# Altium footprint library PCB_THA.PcbLib: 22 footprints (part 1 of 2)
Each footprint in its own frame and in the unit in brackets; x right, y up, seen from the top. Pads: shape width x height; smd on the part's side, far side on the other; paste and mask are expansions set on the pad; w line width, h text height; cw(c..) or ccw(c..) is an arc to the next point about the centre after c.
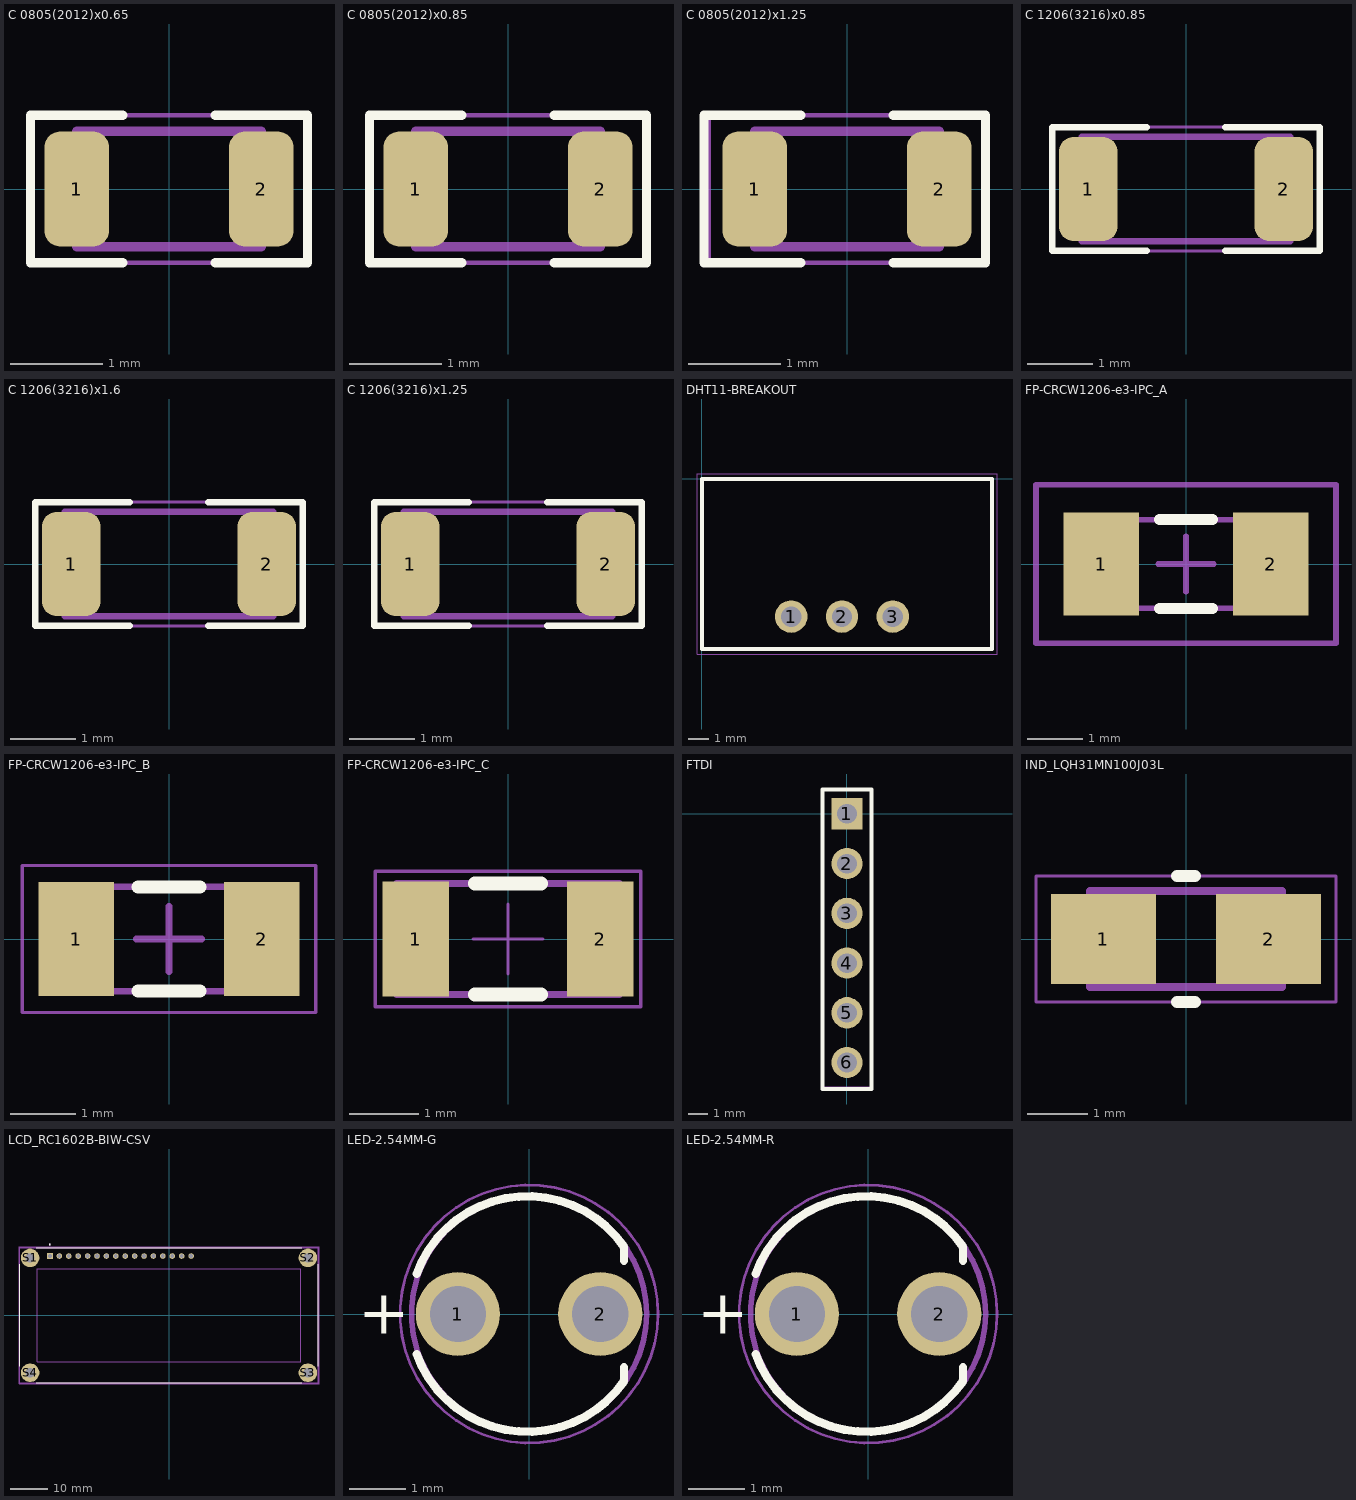
[diagram p0: the footprints below, top view; thin cyan lines are the x and y axes]

## C 0805(2012)x0.65 [mm]
height 0.65
pads (2):
  rrect50% 0.7x1.25 smd: 1(-1,0) 2(1,0)
Top Overlay:
  lines w0.1: -0.5,-0.8 -1.5,-0.8 -1.5,0.8 -0.5,0.8 ; 0.5,-0.8 1.5,-0.8 1.5,0.8 0.5,0.8
Top Designator:
  text ".Designator" at 7.618,-0.508 h1.52
Top 3D Body:
  lines w0.1: -1,-0.625 -1,0.625 1,0.625 1,-0.625 -1,-0.625
Top Courtyard:
  lines w0.05: -1.5,-0.8 1.5,-0.8 1.5,0.8 -1.5,0.8 -1.5,-0.8
3D body "Cap 0805(2012)x65N.STEP": height 0.66, standoff 0, extent -1,-0.625 1,0.625

## C 0805(2012)x0.85 [mm]
height 0.85
pads (2):
  rrect50% 0.7x1.25 smd: 1(-1,0) 2(1,0)
Top Overlay:
  lines w0.1: -0.5,-0.8 -1.5,-0.8 -1.5,0.8 -0.5,0.8 ; 0.5,-0.8 1.5,-0.8 1.5,0.8 0.5,0.8
Top Designator:
  text ".Designator" at 7.618,-0.508 h1.52
Top 3D Body:
  lines w0.1: -1,-0.625 1,-0.625 1,0.625 -1,0.625 -1,-0.625
Top Courtyard:
  lines w0.05: -1.5,-0.8 -1.5,0.8 1.5,0.8 1.5,-0.8 -1.5,-0.8
3D body "Cap 0805(2012)x85N.STEP": height 0.86, standoff 0, extent -1,-0.625 1,0.625

## C 0805(2012)x1.25 [mm]
height 1.25
pads (2):
  rrect50% 0.7x1.25 smd: 1(-1,0) 2(1,0)
Top Overlay:
  lines w0.1: -0.5,-0.8 -1.55,-0.8 -1.55,0.8 -0.5,0.8 ; 0.5,-0.8 1.5,-0.8 1.5,0.8 0.5,0.8
Top Designator:
  text ".Designator" at 7.593,-0.508 h1.52
Top 3D Body:
  lines w0.1: -1,-0.625 1,-0.625 1,0.625 -1,0.625 -1,-0.625
Top Courtyard:
  lines w0.05: -1.5,-0.8 -1.5,0.8 1.5,0.8 1.5,-0.8 -1.5,-0.8
3D body "Cap 0805(2012)x125N.STEP": height 1.26, standoff 0, extent -1,-0.625 1,0.625

## C 1206(3216)x0.85 [mm]
height 0.85
pads (2):
  rrect50% 0.9x1.6 smd mask+0.102: 1(-1.5,0) 2(1.5,0)
Top Overlay:
  lines w0.1: -0.6,-0.95 -2.05,-0.95 -2.05,0.95 -0.6,0.95 ; 0.6,-0.95 2.05,-0.95 2.05,0.95 0.6,0.95
Top Designator:
  text ".Designator" at 7.618,-0.508 h1.52
Top 3D Body:
  lines w0.1: -1.6,-0.8 -1.6,0.8 1.6,0.8 1.6,-0.8 -1.6,-0.8
Top Courtyard:
  lines w0.05: -2.05,-0.95 2.05,-0.95 2.05,0.95 -2.05,0.95 -2.05,-0.95
3D body "Cap 1206(3216)x85N.STEP": height 0.86, standoff 0, extent -1.6,-0.8 1.6,0.8

## C 1206(3216)x1.6 [mm]
height 1.6
pads (2):
  rrect50% 0.9x1.6 smd mask+0.102: 1(-1.5,0) 2(1.5,0)
Top Overlay:
  lines w0.1: -0.6,-0.95 -2.05,-0.95 -2.05,0.95 -0.6,0.95 ; 0.6,-0.95 2.05,-0.95 2.05,0.95 0.6,0.95
Top Designator:
  text ".Designator" at 7.618,-0.508 h1.52
Top 3D Body:
  lines w0.1: -1.6,-0.8 -1.6,0.8 1.6,0.8 1.6,-0.8 -1.6,-0.8
Top Courtyard:
  lines w0.05: -2.05,-0.95 2.05,-0.95 2.05,0.95 -2.05,0.95 -2.05,-0.95
3D body "Cap 1206(3216)x160N.STEP": height 1.61, standoff 0, extent -1.6,-0.8 1.6,0.8

## C 1206(3216)x1.25 [mm]
height 1.25
pads (2):
  rrect50% 0.9x1.6 smd mask+0.102: 1(-1.5,0) 2(1.5,0)
Top Overlay:
  lines w0.1: -0.6,-0.95 -2.05,-0.95 -2.05,0.95 -0.6,0.95 ; 0.6,-0.95 2.05,-0.95 2.05,0.95 0.6,0.95
Top Designator:
  text ".Designator" at 7.618,-0.508 h1.52
Top 3D Body:
  lines w0.1: -1.6,-0.8 -1.6,0.8 1.6,0.8 1.6,-0.8 -1.6,-0.8
Top Courtyard:
  lines w0.05: -2.05,-0.95 2.05,-0.95 2.05,0.95 -2.05,0.95 -2.05,-0.95
3D body "Cap 1206(3216)x125N.STEP": height 1.26, standoff 0, extent -1.6,-0.8 1.6,0.8

## DHT11-BREAKOUT [mm]
pads (3):
  round 1.62 hole 1.02: 1(4.46,-6.89) 2(7,-6.89) 3(9.54,-6.89)
Top Overlay:
  lines w0.2: 0,-8.52 0,0 14.5,0 14.5,-8.52 0,-8.52
Top Designator:
  text ".Designator" at 14.868,-4.768 h1.52
Top 3D Body:
  lines w0.1: 0,-8.52 0,0 14.5,0 14.5,-8.52 0,-8.52
Top Courtyard:
  lines w0.05: -0.25,-8.77 14.75,-8.77 14.75,0.25 -0.25,0.25 -0.25,-8.77
3D body "DHT11 Temp-Humidity Sensor.STEP": height 37.75, standoff 0.67, extent 0,-8.52 14.5,0
3D body "PinSocket_1x03_P2.54mm_Vertical.step": height 3.12, standoff -6.98, extent 3.19,-8.16 10.81,-5.62

## FP-CRCW1206-e3-IPC_A [mm]
pads (2):
  rect 1.356x1.858 smd paste+0 mask+0: 1(-1.526,0) 2(1.526,0)
Top Overlay:
  lines w0.2: -0.473,-0.8 0.473,-0.8 ; -0.473,0.8 0.473,0.8
Top Designator:
  text ".Designator" at 7.618,-0.508 h1.52
Top 3D Body:
  lines w0.1: -1.6,-0.8 1.6,-0.8 1.6,0.8 -1.6,0.8 -1.6,-0.8
Top Courtyard:
  lines w0.1: -0.5,0 0.5,0 ; 0,-0.5 0,0.5 ; -2.704,-1.429 2.704,-1.429 2.704,1.429 -2.704,1.429 -2.704,-1.429
3D body "Res_Vishay_CRCW1206619RFKEB_eec.STEP": height 0.25, standoff 0, extent -2.704,-1.429 2.704,1.429

## FP-CRCW1206-e3-IPC_B [mm]
pads (2):
  rect 1.156x1.758 smd paste+0 mask+0: 1(-1.426,0) 2(1.426,0)
Top Overlay:
  lines w0.2: -0.473,-0.8 0.473,-0.8 ; -0.473,0.8 0.473,0.8
Top Designator:
  text ".Designator" at 7.618,-0.508 h1.52
Top 3D Body:
  lines w0.1: -1.6,-0.8 1.6,-0.8 1.6,0.8 -1.6,0.8 -1.6,-0.8
Top Courtyard:
  lines w0.05: -2.254,-1.129 2.254,-1.129 2.254,1.129 -2.254,1.129 -2.254,-1.129
  lines w0.1: -0.5,0 0.5,0 ; 0,-0.5 0,0.5
3D body "Res_Vishay_CRCW1206619RFKEB_eec.STEP": height 0.25, standoff 0, extent -2.254,-1.129 2.254,1.129

## FP-CRCW1206-e3-IPC_C [mm]
pads (2):
  rect 0.956x1.658 smd paste+0 mask+0: 1(-1.326,0) 2(1.326,0)
Top Overlay:
  lines w0.2: -0.473,-0.8 0.473,-0.8 ; -0.473,0.8 0.473,0.8
Top Designator:
  text ".Designator" at 7.618,-0.508 h1.52
Top 3D Body:
  lines w0.1: -1.6,-0.8 1.6,-0.8 1.6,0.8 -1.6,0.8 -1.6,-0.8
Top Courtyard:
  lines w0.05: -0.5,0 0.5,0 ; 0,-0.5 0,0.5 ; -1.904,-0.975 1.904,-0.975 1.904,0.975 -1.904,0.975 -1.904,-0.975
3D body "Res_Vishay_CRCW1206619RFKEB_eec.STEP": height 0.25, standoff 0, extent -1.904,-0.975 1.904,0.975

## FTDI [mm]
pads (6):
  rect 1.6x1.6 hole 1: 1(0,0)
  round 1.6 hole 1: 2(0,-2.54) 3(0,-5.08) 4(0,-7.62) 5(0,-10.16) 6(0,-12.7)
Top Overlay:
  lines w0.2: -1.25,-14.054 1.25,-14.054 1.25,1.25 -1.25,1.25 -1.25,-14.054
Top Designator:
  text ".Designator" at 7.618,-6.91 h1.52
Top 3D Body:
  lines w0.1: -1.27,-13.97 -1.27,1.27 1.27,1.27 1.27,-13.97 -1.27,-13.97
Top Courtyard:
  lines w0.05: -1.25,-14.054 -1.25,1.25 1.25,1.25 1.25,-14.054 -1.25,-14.054
3D body "1x6.STEP": height 9, standoff -8.64, extent -1.27,-13.97 1.27,1.27

## IND_LQH31MN100J03L [mm]
pads (2):
  rect 1.75x1.5 smd: 1(-1.375,0) 2(1.375,0)
Top Overlay:
  lines w0.2: -0.148,-1.05 0.148,-1.05 ; -0.148,1.05 0.148,1.05
Top Designator:
  text ".Designator" at 7.618,-0.508 h1.52
Top 3D Body:
  lines w0.127: -1.6,-0.8 1.6,-0.8 1.6,0.8 -1.6,0.8 -1.6,-0.8
Top Courtyard:
  lines w0.05: -2.5,-1.05 2.5,-1.05 2.5,1.05 -2.5,1.05 -2.5,-1.05
3D body "step_temp.STEP": height 2, standoff 0, extent -1.6,-0.8 1.6,0.8

## LCD_RC1602B-BIW-CSV [mm]
pads (20):
  rect 1.508x1.508 hole 1: 1(-32.14,16)
  round 1.508 hole 1: 2(-29.6,16) 3(-27.06,16) 4(-24.52,16) 5(-21.98,16) 6(-19.44,16) 7(-16.9,16) 8(-14.36,16) 9(-11.82,16) 10(-9.28,16) 11(-6.74,16) 12(-4.2,16) 13(-1.66,16) 14(0.88,16) 15(3.42,16) 16(5.96,16)
  round 5 hole 2.5: S1(-37.5,15.5) S2(37.5,15.5) S3(37.5,-15.5) S4(-37.5,-15.5)
Top Overlay:
  circle w0.2: c-32.2,19.1 r0.1
  lines w0.2: -40.25,-13.8 -40.25,13.8 ; -35.8,-18.25 35.8,-18.25 ; -35.8,18.25 35.8,18.25 ; 40.25,-13.8 40.25,13.8
Top Designator:
  text ".Designator" at 7.618,-0.12 h1.52
Top 3D Body:
  circle w0.2: c-32.2,19.1 r0.1
  lines w0.127: -40.25,-18.25 -40.25,18.25 40.25,18.25 40.25,-18.25 -40.25,-18.25 ; -35.6,-12.6 -35.6,12.6 35.6,12.6 35.6,-12.6 -35.6,-12.6
Top Courtyard:
  lines w0.05: -40.5,-18.5 -40.5,18.5 40.5,18.5 40.5,-18.5 -40.5,-18.5
3D body "step_temp.STEP": height 10.51, standoff -2.99, extent -40,-18 40,18

## LED-2.54MM-G [mm]
pads (2):
  round 1.5 hole 1: 1(-1.27,0) 2(1.27,0)
Top Overlay:
  lines w0.15: -2.003,-0.719 ccw(c-0.03,0) 1.694,-1.199 1.694,-0.95 ; -2.003,0.719 cw(c-0.03,0) 1.694,1.199 1.694,0.95
  text "+" at -3.05,-0.35 h0.8
Top Designator:
  text ".Designator" at 7.205,-0.508 h1.52
Top 3D Body:
  circle w0.1: c0,0 r2.097
  text "+" at -3.05,-0.35 h0.8
Top Courtyard:
  circle w0.05: c0,0 r2.3
3D body "everlight-3MM-LED-GREEN.STEP": height 5.21, standoff -7.35, extent -1.882,-1.9 1.544,1.9

## LED-2.54MM-R [mm]
pads (2):
  round 1.5 hole 1: 1(-1.27,0) 2(1.27,0)
Top Overlay:
  lines w0.15: -2.003,-0.719 ccw(c-0.03,0) 1.694,-1.199 1.694,-0.95 ; -2.003,0.719 cw(c-0.03,0) 1.694,1.199 1.694,0.95
  text "+" at -3.05,-0.35 h0.8
Top Designator:
  text ".Designator" at 7.205,-0.508 h1.52
Top 3D Body:
  circle w0.1: c0,0 r2.097
  text "+" at -3.05,-0.35 h0.8
Top Courtyard:
  circle w0.05: c0,0 r2.3
3D body "everlight-3MM-LED-RED.STEP": height 5.21, standoff -7.35, extent -1.882,-1.9 1.544,1.9

## PCBComponent_1 [mm]
Top Designator:
  text ".Designator" at 7.605,-0.521 h1.52